# Altium footprint library PCB_GENERAL.PcbLib: 226 footprints (part 4 of 15)
Each footprint in its own frame and in the unit in brackets; x right, y up, seen from the top. Pads: shape width x height; smd on the part's side, far side on the other; paste and mask are expansions set on the pad; w line width, h text height; cw(c..) or ccw(c..) is an arc to the next point about the centre after c.
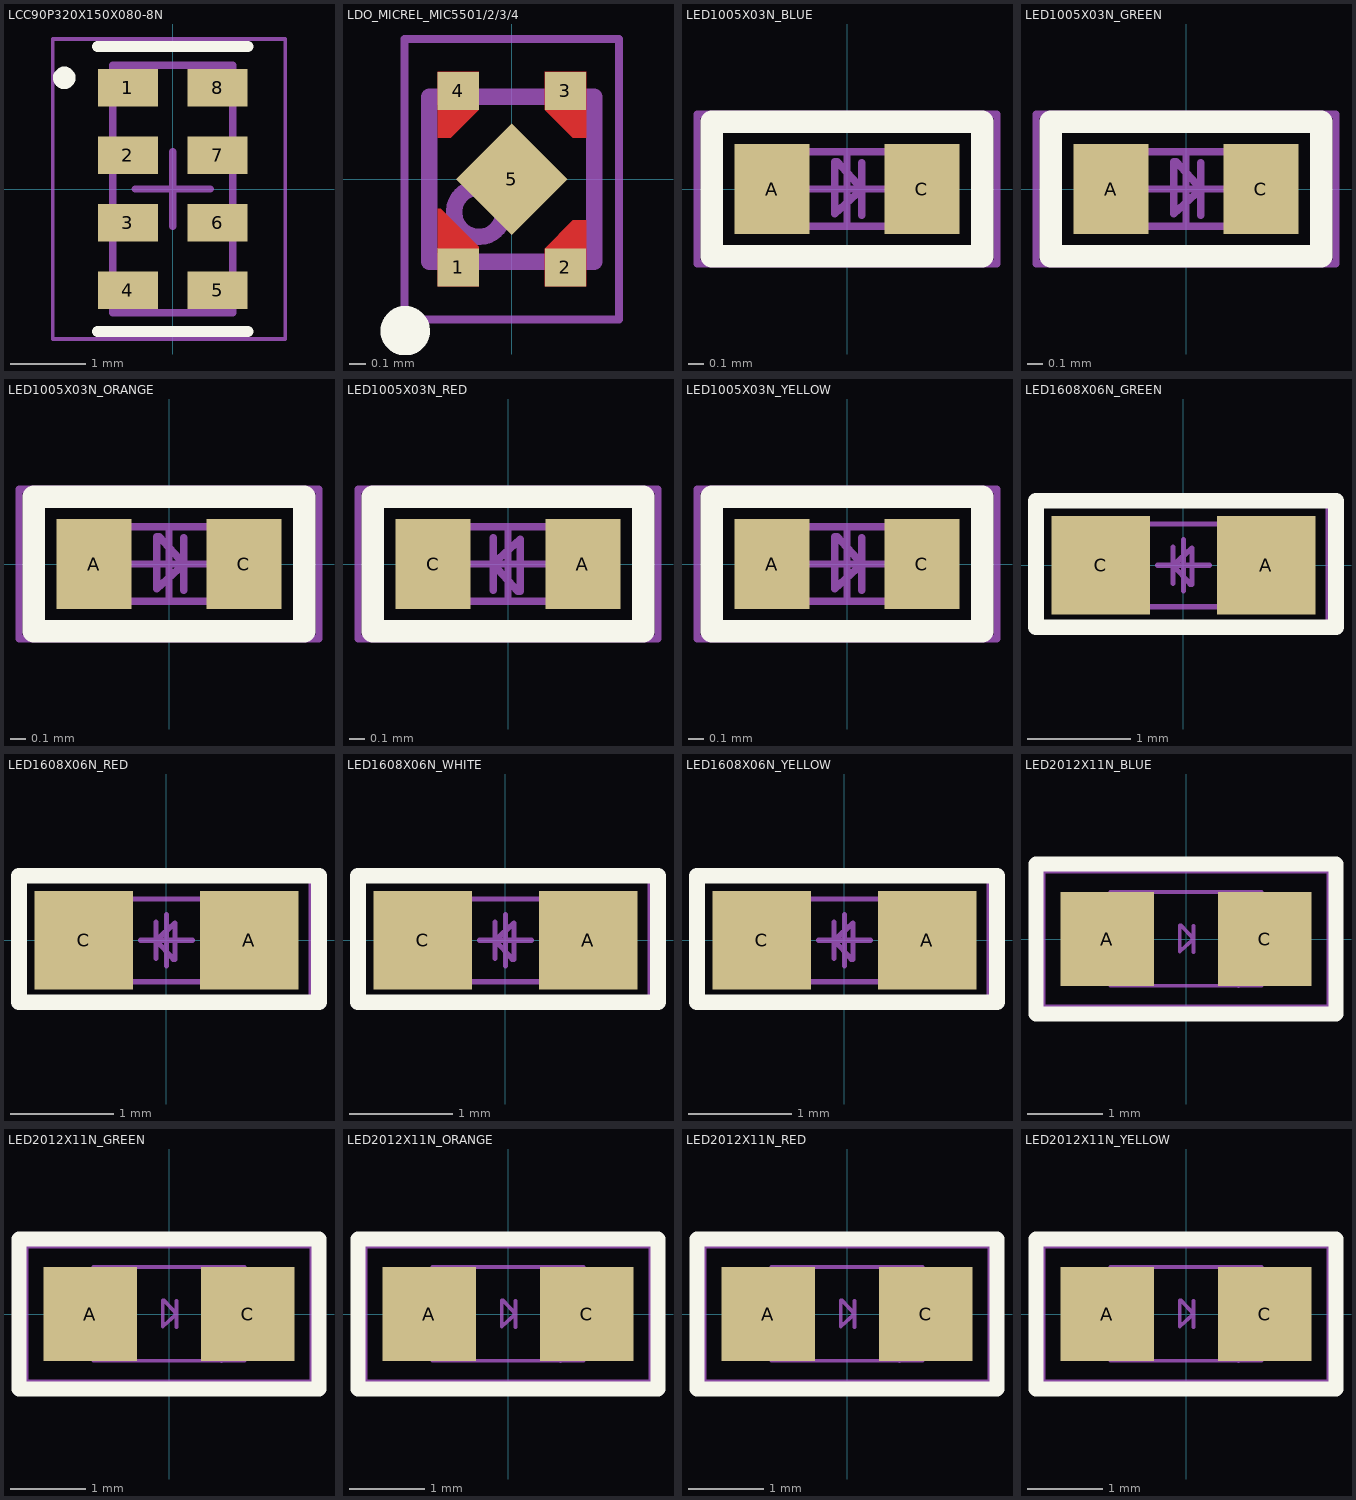
[diagram p3: the footprints below, top view; thin cyan lines are the x and y axes]

## LCC90P320X150X080-8N [mm] "Leadless Chip Carrier, 8-Leads, Pitch 0,90mm,  Body 3,20x1,50mm,  IPC Medium Density"
height 0.8
pads (8):
  rect 0.8x0.5 smd: 1(-0.6,1.35) 2(-0.6,0.45) 3(-0.6,-0.45) 4(-0.6,-1.35) 5(0.6,-1.35) 6(0.6,-0.45) 7(0.6,0.45) 8(0.6,1.35)
Top Overlay:
  lines w0.15: -1,-1.9 1,-1.9 ; -1,1.9 1,1.9
  lines w0.2: -1.4,1.5 ccw(c-1.446,1.481) -1.396,1.481
Mechanical 11:
  text ".Designator" at -1.4,2.325 h1
Mechanical 14:
  lines w0.1: -0.8,-1.65 0.8,-1.65 0.8,1.65 -0.8,1.65 -0.8,-1.65
Mechanical 15:
  lines w0.05: -1.6,-2 1.5,-2 1.5,2 -1.6,2 -1.6,-2
  lines w0.1: -0.5,0 0.5,0 ; 0,-0.5 0,0.5
3D body "User Library-M41T62.step": height 0.8, standoff 0, extent -0.75,-1.6 0.75,1.6

## LDO_MICREL_MIC5501/2/3/4 [mm] "1mm x 1mm LDO"
height 0.6
pads (5):
  rect 0.25x0.23 smd mask-1: 1(-0.325,-0.535) 2(0.325,-0.535) 3(0.325,0.535) 4(-0.325,0.535)
  rect 0.48x0.48 smd rot 45: 5(0,0)
Top Layer:
  region: 0.2,0.42 0.37,0.25 0.45,0.25 0.45,0.65 0.2,0.65
  region: -0.2,0.42 -0.37,0.25 -0.45,0.25 -0.45,0.65 -0.2,0.65
  region: 0.2,-0.42 0.37,-0.25 0.45,-0.25 0.45,-0.65 0.2,-0.65
  region: -0.2,-0.41 -0.43,-0.18 -0.45,-0.18 -0.45,-0.65 -0.2,-0.65
Top Overlay:
  lines w0.2: -0.6,-0.9 ccw(c-0.646,-0.919) -0.596,-0.919
Top Paste:
  region: -0.45,-0.65 -0.45,-0.18 -0.2,-0.42 -0.2,-0.65
  region: 0.2,-0.42 0.37,-0.25 0.45,-0.25 0.45,-0.42 0.45,-0.65 0.2,-0.65
  region: 0.2,0.42 0.37,0.25 0.45,0.25 0.45,0.65 0.2,0.65
  region: -0.2,0.42 -0.37,0.25 -0.45,0.25 -0.45,0.65 -0.2,0.65
Top Solder:
  region: 0.1,0.75 0.55,0.75 0.55,0.15 0.37,0.15 0.1,0.42
  region: -0.1,0.75 -0.55,0.75 -0.55,0.15 -0.37,0.15 -0.1,0.42
  region: -0.1,-0.75 -0.55,-0.75 -0.55,-0.08 -0.44,-0.08 -0.1,-0.42
  region: 0.1,-0.75 0.55,-0.75 0.55,-0.15 0.37,-0.15 0.1,-0.42
Mechanical 11:
  text ".Designator" at -0.75,0 h0.3
Mechanical 14:
  circle w0.1: c-0.2,-0.2 r0.15
  lines w0.1: -0.5,-0.5 0.5,-0.5 0.5,0.5 -0.5,0.5 -0.5,-0.5
Mechanical 15:
  lines w0.05: -0.25,0 0.25,0 ; 0,-0.25 0,0.25 ; -0.65,-0.85 -0.65,0.85 0.65,0.85 0.65,-0.85 -0.65,-0.85
3D body: height 0.6, standoff 0.05, extent -0.5,-0.5 0.5,0.5

## LED1005X03N_BLUE [mm] "LED,  2-Leads, Body 1,00x0,50mm, IPC Low Density"
height 0.6
pads (2):
  rect 0.5x0.6 smd mask+0.05: A(-0.5,0) C(0.5,0)
Top Overlay:
  lines w0.15: -0.9,-0.45 -0.9,0.45 0.9,0.45 0.9,-0.45 -0.9,-0.45
Mechanical 11:
  text ".Designator" at -0.9,0.7 h0.3
Mechanical 14:
  lines w0.05: -0.3,-0.25 -0.3,0.25 ; -0.083,0.183 -0.083,-0.166 0.1,0 -0.066,0.183 ; 0.1,-0.175 0.1,0.174 ; 0.3,-0.25 0.3,0.25 ; -0.5,-0.25 0.5,-0.25 0.5,0.25 -0.5,0.25 -0.5,-0.25
Mechanical 15:
  lines w0.05: -0.25,0 0.25,0 ; 0,-0.25 0,0.25 ; -1,-0.5 1,-0.5 1,0.5 -1,0.5 -1,-0.5
3D body "User Library-led_0402LED0402 blue.STEP": height 0.45, standoff 0, extent -0.505,-0.25 0.505,0.25

## LED1005X03N_GREEN [mm] "LED,  2-Leads, Body 1,00x0,50mm, IPC Low Density"
height 0.6
pads (2):
  rect 0.5x0.6 smd mask+0.05: A(-0.5,0) C(0.5,0)
Top Overlay:
  lines w0.15: -0.9,-0.45 0.9,-0.45 0.9,0.45 -0.9,0.45 -0.9,-0.45
Mechanical 11:
  text ".Designator" at -0.9,0.7 h0.3
Mechanical 14:
  lines w0.05: -0.3,-0.25 -0.3,0.25 ; -0.083,0.183 -0.083,-0.166 0.1,0 -0.066,0.183 ; 0.1,-0.175 0.1,0.174 ; 0.3,-0.25 0.3,0.25 ; -0.5,-0.25 -0.5,0.25 0.5,0.25 0.5,-0.25 -0.5,-0.25
Mechanical 15:
  lines w0.05: -0.25,0 0.25,0 ; 0,-0.25 0,0.25 ; -1,-0.5 -1,0.5 1,0.5 1,-0.5 -1,-0.5
3D body "User Library-led_0402LED0402 green.STEP": height 0.45, standoff 0, extent -0.505,-0.25 0.505,0.25

## LED1005X03N_ORANGE [mm] "LED,  2-Leads, Body 1,00x0,50mm, IPC Low Density"
height 0.6
pads (2):
  rect 0.5x0.6 smd mask+0.05: A(-0.5,0) C(0.5,0)
Top Overlay:
  lines w0.15: -0.9,-0.45 0.9,-0.45 0.9,0.45 -0.9,0.45 -0.9,-0.45
Mechanical 11:
  text ".Designator" at -0.9,0.7 h0.3
Mechanical 14:
  lines w0.05: -0.3,-0.25 -0.3,0.25 ; -0.083,0.183 -0.083,-0.166 0.1,0 -0.066,0.183 ; 0.1,-0.175 0.1,0.174 ; 0.3,-0.25 0.3,0.25 ; -0.5,-0.25 -0.5,0.25 0.5,0.25 0.5,-0.25 -0.5,-0.25
Mechanical 15:
  lines w0.05: -0.25,0 0.25,0 ; 0,-0.25 0,0.25 ; -1,-0.5 -1,0.5 1,0.5 1,-0.5 -1,-0.5
3D body "User Library-led_0402LED0402 orange.STEP": height 0.45, standoff 0, extent -0.505,-0.25 0.505,0.25

## LED1005X03N_RED [mm] "LED,  2-Leads, Body 1,00x0,50mm, IPC Low Density"
height 0.6
pads (2):
  rect 0.5x0.6 smd mask+0.05: A(0.5,0) C(-0.5,0)
Top Overlay:
  lines w0.15: -0.9,-0.45 -0.9,0.45 0.9,0.45 0.9,-0.45 -0.9,-0.45
Mechanical 11:
  text ".Designator" at -0.9,0.7 h0.3
Mechanical 14:
  lines w0.05: -0.3,-0.25 -0.3,0.25 ; -0.1,-0.174 -0.1,0.175 ; 0.066,-0.183 -0.1,0 0.083,0.166 0.083,-0.183 ; 0.3,-0.25 0.3,0.25 ; -0.5,-0.25 0.5,-0.25 0.5,0.25 -0.5,0.25 -0.5,-0.25
Mechanical 15:
  lines w0.05: -0.25,0 0.25,0 ; 0,-0.25 0,0.25 ; -1,-0.5 1,-0.5 1,0.5 -1,0.5 -1,-0.5
3D body "User Library-led_0402LED0402 red.STEP": height 0.45, standoff 0, extent -0.505,-0.25 0.505,0.25

## LED1005X03N_YELLOW [mm] "LED,  2-Leads, Body 1,00x0,50mm, IPC Low Density"
height 0.6
pads (2):
  rect 0.5x0.6 smd mask+0.05: A(-0.5,0) C(0.5,0)
Top Overlay:
  lines w0.15: -0.9,-0.45 -0.9,0.45 0.9,0.45 0.9,-0.45 -0.9,-0.45
Mechanical 11:
  text ".Designator" at -0.9,0.7 h0.3
Mechanical 14:
  lines w0.05: -0.3,-0.25 -0.3,0.25 ; -0.083,0.183 -0.083,-0.166 0.1,0 -0.066,0.183 ; 0.1,-0.175 0.1,0.174 ; 0.3,-0.25 0.3,0.25 ; -0.5,-0.25 0.5,-0.25 0.5,0.25 -0.5,0.25 -0.5,-0.25
Mechanical 15:
  lines w0.05: -0.25,0 0.25,0 ; 0,-0.25 0,0.25 ; -1,-0.5 1,-0.5 1,0.5 -1,0.5 -1,-0.5
3D body "User Library-led_0402LED0402 yellow.STEP": height 0.45, standoff 0, extent -0.505,-0.25 0.505,0.25

## LED1608X06N_GREEN [mm] "Chip LED, 2-Leads, Body 1,60x0,80mm, IPC Low Density"
height 0.6
pads (2):
  rect 0.95x0.95 smd mask+0.05: A(0.8,0) C(-0.8,0)
Top Overlay:
  lines w0.15: -1.425,-0.6 1.475,-0.6 1.475,0.625 -1.425,0.625 -1.425,-0.6
Mechanical 11:
  text ".Designator" at -1.325,0.925 h0.3
Mechanical 14:
  lines w0.05: -0.6,-0.4 -0.6,0.4 ; -0.1,-0.174 -0.1,0.175 ; 0.066,-0.183 -0.1,0 0.083,0.166 0.083,-0.183 ; 0.6,-0.4 0.6,0.4 ; -0.8,-0.4 -0.8,0.4 0.8,0.4 0.8,-0.4 -0.8,-0.4
Mechanical 15:
  lines w0.05: -0.25,0 0.25,0 ; 0,-0.25 0,0.25 ; -1.4,-0.6 -1.4,0.6 1.4,0.6 1.4,-0.6 -1.4,-0.6
3D body "User Library-led0603_GRE.step": height 1.1, standoff 0, extent -0.81,-0.4 0.81,0.4

## LED1608X06N_RED [mm] "Chip LED, 2-Leads, Body 1,60x0,80mm, IPC Low Density"
height 0.6
pads (2):
  rect 0.95x0.95 smd mask+0.05: A(0.8,0) C(-0.8,0)
Top Overlay:
  lines w0.15: -1.425,-0.6 1.475,-0.6 1.475,0.625 -1.425,0.625 -1.425,-0.6
Mechanical 11:
  text ".Designator" at -1.325,0.925 h0.3
Mechanical 14:
  lines w0.05: -0.6,-0.4 -0.6,0.4 ; -0.1,-0.174 -0.1,0.175 ; 0.066,-0.183 -0.1,0 0.083,0.166 0.083,-0.183 ; 0.6,-0.4 0.6,0.4 ; -0.8,-0.4 -0.8,0.4 0.8,0.4 0.8,-0.4 -0.8,-0.4
Mechanical 15:
  lines w0.05: -0.25,0 0.25,0 ; 0,-0.25 0,0.25 ; -1.4,-0.6 -1.4,0.6 1.4,0.6 1.4,-0.6 -1.4,-0.6
3D body "User Library-led0603_RED.step": height 1.1, standoff 0, extent -0.81,-0.4 0.81,0.4

## LED1608X06N_WHITE [mm] "Chip LED, 2-Leads, Body 1,60x0,80mm, IPC Low Density"
height 0.6
pads (2):
  rect 0.95x0.95 smd mask+0.05: A(0.8,0) C(-0.8,0)
Top Overlay:
  lines w0.15: -1.425,-0.6 1.475,-0.6 1.475,0.625 -1.425,0.625 -1.425,-0.6
Mechanical 11:
  text ".Designator" at -1.325,0.925 h0.3
Mechanical 14:
  lines w0.05: -0.6,-0.4 -0.6,0.4 ; -0.1,-0.174 -0.1,0.175 ; 0.066,-0.183 -0.1,0 0.083,0.166 0.083,-0.183 ; 0.6,-0.4 0.6,0.4 ; -0.8,-0.4 -0.8,0.4 0.8,0.4 0.8,-0.4 -0.8,-0.4
Mechanical 15:
  lines w0.05: -0.25,0 0.25,0 ; 0,-0.25 0,0.25 ; -1.4,-0.6 -1.4,0.6 1.4,0.6 1.4,-0.6 -1.4,-0.6
3D body "User Library-LED SMD0603.step": height 0.68, standoff 0, extent -0.825,-0.375 0.825,0.35

## LED1608X06N_YELLOW [mm] "Chip LED, 2-Leads, Body 1,60x0,80mm, IPC Low Density"
height 0.6
pads (2):
  rect 0.95x0.95 smd mask+0.05: A(0.8,0) C(-0.8,0)
Top Overlay:
  lines w0.15: -1.425,-0.6 -1.425,0.625 1.475,0.625 1.475,-0.6 -1.425,-0.6
Mechanical 11:
  text ".Designator" at -1.325,0.925 h0.3
Mechanical 14:
  lines w0.05: -0.6,-0.4 -0.6,0.4 ; -0.1,-0.174 -0.1,0.175 ; 0.066,-0.183 -0.1,0 0.083,0.166 0.083,-0.183 ; 0.6,-0.4 0.6,0.4 ; -0.8,-0.4 0.8,-0.4 0.8,0.4 -0.8,0.4 -0.8,-0.4
Mechanical 15:
  lines w0.05: -0.25,0 0.25,0 ; 0,-0.25 0,0.25 ; -1.4,-0.6 1.4,-0.6 1.4,0.6 -1.4,0.6 -1.4,-0.6
3D body "User Library-led0603_YEL.step": height 1.1, standoff 0, extent -0.81,-0.4 0.81,0.4

## LED2012X11N_BLUE [mm] "Chip LED, 2-Leads, Body 2.00x1.25mm, IPC Low Density"
height 1.1
pads (2):
  rect 1.25x1.25 smd: A(-1.05,0) C(1.05,0)
Top Overlay:
  lines w0.2: -2,-1 -2,1 2,1 2,-1 -2,-1
Mechanical 11:
  text ".Designator" at -1.8,1.2 h1
Mechanical 14:
  lines w0.05: -0.7,-0.625 -0.7,0.625 ; -0.083,0.183 -0.083,-0.166 0.1,0 -0.066,0.183 ; 0.1,-0.175 0.1,0.174 ; 0.7,-0.625 0.7,0.625 ; -1.01,-0.625 -1.01,0.625 1.01,0.625 1.01,-0.625 -1.01,-0.625
Mechanical 15:
  lines w0.05: -1.9,-0.9 1.9,-0.9 1.9,0.9 -1.9,0.9 -1.9,-0.9
3D body "User Library-led_0805BLUE.step": height 1.1, standoff 0, extent -1.01,-0.625 1.01,0.625

## LED2012X11N_GREEN [mm] "Chip LED, 2-Leads, Body 2.00x1.25mm, IPC Low Density"
height 1.1
pads (2):
  rect 1.25x1.25 smd: A(-1.05,0) C(1.05,0)
Top Overlay:
  lines w0.2: -2,-1 -2,1 2,1 2,-1 -2,-1
Mechanical 11:
  text ".Designator" at -1.8,1.2 h1
Mechanical 14:
  lines w0.05: -0.7,-0.625 -0.7,0.625 ; -0.083,0.183 -0.083,-0.166 0.1,0 -0.066,0.183 ; 0.1,-0.175 0.1,0.174 ; 0.7,-0.625 0.7,0.625 ; -1.01,-0.625 -1.01,0.625 1.01,0.625 1.01,-0.625 -1.01,-0.625
Mechanical 15:
  lines w0.05: -1.9,-0.9 1.9,-0.9 1.9,0.9 -1.9,0.9 -1.9,-0.9
3D body "User Library-led_0805GREEN.step": height 1.1, standoff 0, extent -1.01,-0.625 1.01,0.625

## LED2012X11N_ORANGE [mm] "Chip LED, 2-Leads, Body 2.00x1.25mm, IPC Low Density"
height 1.1
pads (2):
  rect 1.25x1.25 smd: A(-1.05,0) C(1.05,0)
Top Overlay:
  lines w0.2: -2,-1 -2,1 2,1 2,-1 -2,-1
Mechanical 11:
  text ".Designator" at -1.8,1.2 h1
Mechanical 14:
  lines w0.05: -0.7,-0.625 -0.7,0.625 ; -0.083,0.183 -0.083,-0.166 0.1,0 -0.066,0.183 ; 0.1,-0.175 0.1,0.174 ; 0.7,-0.625 0.7,0.625 ; -1.01,-0.625 -1.01,0.625 1.01,0.625 1.01,-0.625 -1.01,-0.625
Mechanical 15:
  lines w0.05: -1.9,-0.9 1.9,-0.9 1.9,0.9 -1.9,0.9 -1.9,-0.9
3D body "User Library-led_0805ORANGE.step": height 1.1, standoff 0, extent -1.01,-0.625 1.01,0.625

## LED2012X11N_RED [mm] "Chip LED, 2-Leads, Body 2.00x1.25mm, IPC Low Density"
height 1.1
pads (2):
  rect 1.25x1.25 smd: A(-1.05,0) C(1.05,0)
Top Overlay:
  lines w0.2: -2,-1 -2,1 2,1 2,-1 -2,-1
Mechanical 11:
  text ".Designator" at -1.8,1.2 h1
Mechanical 14:
  lines w0.05: -0.7,-0.625 -0.7,0.625 ; -0.083,0.183 -0.083,-0.166 0.1,0 -0.066,0.183 ; 0.1,-0.175 0.1,0.174 ; 0.7,-0.625 0.7,0.625 ; -1.01,-0.625 -1.01,0.625 1.01,0.625 1.01,-0.625 -1.01,-0.625
Mechanical 15:
  lines w0.05: -1.9,-0.9 1.9,-0.9 1.9,0.9 -1.9,0.9 -1.9,-0.9
3D body "User Library-led_0805RED.step": height 1.1, standoff 0, extent -1.01,-0.625 1.01,0.625

## LED2012X11N_YELLOW [mm] "Chip LED, 2-Leads, Body 2.00x1.25mm, IPC Low Density"
height 1.1
pads (2):
  rect 1.25x1.25 smd: A(-1.05,0) C(1.05,0)
Top Overlay:
  lines w0.2: -2,-1 2,-1 2,1 -2,1 -2,-1
Mechanical 11:
  text ".Designator" at -1.8,1.2 h1
Mechanical 14:
  lines w0.05: -0.7,-0.625 -0.7,0.625 ; -0.083,0.183 -0.083,-0.166 0.1,0 -0.066,0.183 ; 0.1,-0.175 0.1,0.174 ; 0.7,-0.625 0.7,0.625 ; -1.01,-0.625 1.01,-0.625 1.01,0.625 -1.01,0.625 -1.01,-0.625
Mechanical 15:
  lines w0.05: -1.9,-0.9 -1.9,0.9 1.9,0.9 1.9,-0.9 -1.9,-0.9
3D body "User Library-led_0805YELLOW.step": height 1.1, standoff 0, extent -1.01,-0.625 1.01,0.625